# Altium footprint library CADTcommon.PcbLib: 503 footprints (part 1 of 32)
Each footprint in its own frame and in the unit in brackets; x right, y up, seen from the top. Pads: shape width x height; smd on the part's side, far side on the other; paste and mask are expansions set on the pad; w line width, h text height; cw(c..) or ccw(c..) is an arc to the next point about the centre after c.
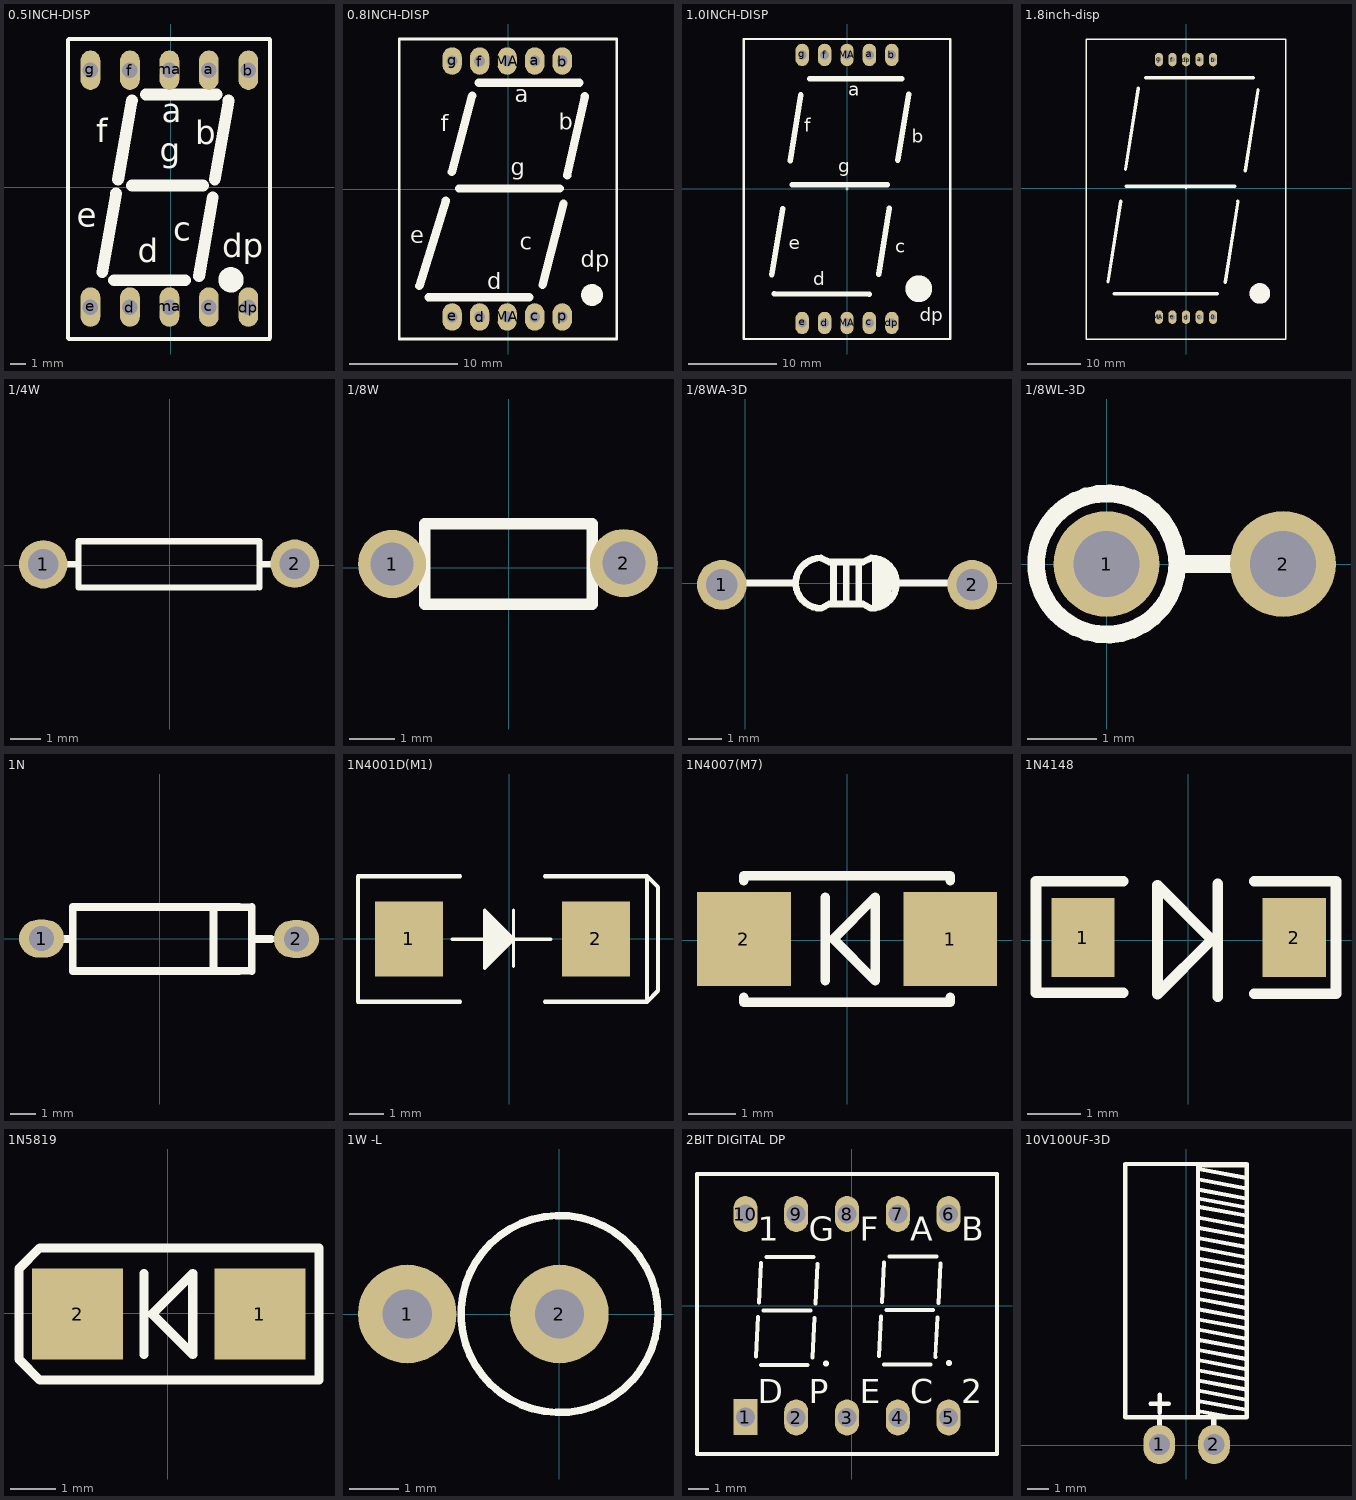
[diagram p0: the footprints below, top view; thin cyan lines are the x and y axes]

## 0.5INCH-DISP [mil]
pads (10):
  oval 50x100 hole 39.37: a(97,297) b(197,297) c(97,-303) d(-103,-303) dp(197,-303) e(-203,-303) f(-103,297) g(-203,297) ma(-3,-303) ma(-3,297)
Top Overlay:
  circle w40: c153,-234 r12
  lines w10: -260,-382 -260,374 ; -258,-384 251,-384 ; -258,376 251,376 ; 252,-380 252,374
  lines w30: -173,-215 -138,-15 ; -143,-235 37,-235 ; -133,20 -98,220 ; -98,5 82,5 ; -63,235 117,235 ; 72,-225 107,-25 ; 112,20 147,220
  text "c" at 7,-135 h60
  text "dp" at 131,-177 h60
  text "e" at -238,-100 h60
  text "d" at -83,-190 h60
  text "a" at -23,165 h60
  text "g" at -28,65 h60
  text "b" at 62,110 h60
  text "f" at -188,115 h60
3D body: height 316.25, standoff -156.19, extent -252,-378 248,372

## 0.8INCH-DISP [mil]
pads (10):
  oval 70x100 hole 39.37: a(97,465) b(197,465) c(97,-465) d(-103,-465) e(-203,-465) f(-103,465) g(-203,465) MA(-3,-465) MA(-3,465) p(197,-465)
Top Overlay:
  circle w40: c305.31,-385 r19.68
  lines w10: -395,-545 -395,545 395,545 395,-545 -395,-545
  lines w30: -322,-352 -226,-42 ; -289,-393 77.14,-393 ; -204,62 -130,339 ; -177.68,2.24 188.47,2.24 ; -108,-478 -103,-473 ; -106.14,386 260,386 ; 125,-349 202,-53 ; 215,49 279,337
  text "a" at 25,315 h60
  text "g" at 10,50 h60
  text "c" at 43,-220 h60
  text "d" at -75,-365 h60
  text "e" at -355,-198 h60
  text "f" at -245,210 h60
  text "dp" at 265,-285 h60
  text "b" at 185,215 h60

## 1.0INCH-DISP [mil]
pads (10):
  oval 60x100 hole 39.37: a(100,598) b(200,598) c(100,-598) d(-100,-598) dp(200,-598) e(-200,-598) f(-100,598) g(-200,598) MA(0,-598) MA(0,598)
Top Overlay:
  lines w2: -6,0 6,0 ; 0,-6 0,5
  lines w10: -461,-10 -461,10 ; -460.88,-669.58 -460.88,669 ; -459.88,-669.58 461,-669.58 461,669 -459.88,669
  lines w25: -335,-382 -287,-89 ; -324,-467 99,-470 ; -254,126 -206,419 ; -244,19 179,19 ; -167,492 245,492 ; 141,-380 189,-87 ; 227,129 275,422
  text "a" at 5,415 h60
  text "b" at 290,205 h60
  text "c" at 215,-285 h60
  text "d" at -150,-430 h60
  text "e" at -260,-270 h60
  text "f" at -190,255 h60
  text "dp" at 325,-590 h60
  text "g" at -40,75 h60
Top Overlay keep-out:
  circle w100: c320.57,-445 r9.43

## 1.8inch-disp [mm]
pads (10):
  oval 1.524x2.54 hole 1: 0(5.08,-24.13) a(2.54,24.13) b(5.08,24.13) c(2.54,-24.13) d(0,-24.13) dp(0,24.13) e(-2.54,-24.13) f(-2.54,24.13) g(-5.08,24.13) MA(-5.08,-24.13)
Top Overlay:
  lines w0.051: -0.127,0 0.127,0 ; 0,-0.127 0,0.102
  lines w0.254: -18.694,-28.219 -18.694,27.981 18.694,27.981 18.694,-28.219 -18.694,-28.219
  lines w0.635: -14.605,-17.551 -12.217,-2.362 ; -13.411,-19.761 5.842,-19.761 ; -11.328,3.531 -8.941,18.72 ; -11.227,0.381 9.119,0.381 ; -7.595,20.701 12.598,20.701 ; 7.341,-17.628 9.728,-2.438 ; 11.1,3.251 13.487,18.44
Top Overlay keep-out:
  circle w2.54: c13.827,-19.685 r0.651

## 1/4W [mm]
pads (2):
  round 1.6 hole 1: 1(-4.172,0.029) 2(4.128,0.049)
Top Overlay:
  lines w0.203: -3.514,0.029 -3.006,0.029 ; 2.836,-0.733 -3.006,-0.733 -3.006,0.791 2.963,0.791 2.963,-0.733 ; 2.963,0.029 3.471,0.029
3D body: height 3.12, standoff -2.06, extent -5.359,-1.092 5.359,1.143

## 1/8W [mm]
pads (2):
  round 1.5 hole 0.95: 1(-2.567,0.084) 2(2.533,0.104)
Top Overlay:
  lines w0.254: -1.845,-0.805 -1.845,0.973 1.838,0.973 1.838,-0.805 -1.845,-0.805

## 1/8WA-3D [mm]
pads (2):
  round 1.5 hole 0.95: 1(-0.711,-0.051) 2(6.858,-0.051)
Top Overlay:
  lines w0.203: 0,0 1.524,0 ; 2.667,-0.635 2.667,0.635 ; 3.048,-0.635 3.048,0.635 ; 3.429,-0.635 3.429,0.635 ; 3.937,-0.635 3.937,0.635 ; 4.064,-0.635 4.064,0.635 ; 4.191,-0.635 4.191,0.508 ; 4.318,-0.381 4.318,0.381 ; 4.445,-0.127 4.445,0.254 ; 4.572,0 6.096,0 ; 2.286,-0.762 cw(c2.286,0) 2.286,0.762 2.54,0.635 3.556,0.635 3.81,0.762 cw(c3.81,0) 3.81,-0.762 3.556,-0.635 2.54,-0.635 2.286,-0.762
3D body: height 2.42, standoff -3.48, extent -0.952,-0.914 7.048,0.886

## 1/8WL-3D [mil]
pads (2):
  round 60 hole 37.4: 1(0,0) 2(100,0)
Top Overlay:
  circle w10: c0,0 r40
  lines w10: 40,0 70,0
3D body: height 285.43, standoff -59.06, extent -36.08,-37 110.08,35.48

## 1N [mm]
pads (2):
  oval 1.8x1.5 hole 1: 1(-4.699,0) 2(5.418,-0.017)
Top Overlay:
  lines w0.3: -3.464,1.253 3.648,1.253 ; 0.846,-1.287 3.648,-1.287
  lines w0.305: -4.226,-0.017 -3.464,-0.017 ; 2.128,-1.287 2.128,1.253 ; 3.14,-1.287 -3.464,-1.287 -3.464,1.253 3.14,1.253 ; 3.648,-1.287 3.648,1.253 ; 3.648,-0.017 4.41,-0.017

## 1N4001D(M1) [mm]
pads (2):
  rect 2x2.2 smd: 1(-2.945,0) 2(2.555,0)
Top Overlay:
  lines w0.1: -1.67,-0.006 1.23,-0.006 ; -0.67,0.744 -0.67,-0.756 0.03,-0.056 0.03,-0.006 -0.62,0.644 -0.62,-0.606 -0.07,-0.056 -0.07,-0.006 -0.57,0.494 -0.52,0.444 -0.52,-0.456 ; -0.62,-0.456 -0.62,-0.506 -0.57,-0.506 -0.17,-0.106 -0.17,-0.006 ; -0.418,-0.254 -0.418,0.142 ; -0.37,0.094 -0.37,-0.156 -0.37,0.194 ; -0.295,-0.131 -0.295,0.119 ; 0.13,-0.806 0.13,0.844 ; -0.17,-0.006 -0.47,0.294 -0.47,-0.306 -0.17,-0.006 ; -0.72,-0.856 -0.72,0.844 0.13,-0.006 -0.72,-0.856
  lines w0.127: -4.445,1.85 -4.445,-1.85 -1.445,-1.85 ; -4.437,1.85 -1.445,1.85 ; 1.055,-1.85 4.055,-1.85 ; 1.055,1.85 4.055,1.85 ; 4.055,-1.85 4.055,1.85 ; 4.055,-1.85 4.38,-1.525 4.38,1.525 4.055,1.85
3D body: height 1, standoff -1.4, extent -2.829,-1.305 2.371,1.295

## 1N4007(M7) [mm]
pads (2):
  rect 2x2 smd: 1(2.193,0.027) 2(-2.207,0.027)
Top Overlay:
  lines w0.2: -2.207,-1.212 -2.207,-1.323 2.193,-1.323 2.193,-1.212 ; -2.207,1.265 -2.207,1.377 2.193,1.377 2.193,1.265 ; -0.474,-0.862 -0.474,0.027 -0.474,0.916 ; -0.296,0.027 0.593,-0.862 0.593,0.916 -0.296,0.027
3D body: height 2.3, standoff 0, extent -2.525,-1.3 2.575,1.3

## 1N4148 [mm]
pads (2):
  rect 1.2x1.5 smd: 1(-1.994,0.053) 2(2.006,0.053)
Top Overlay:
  lines w0.2: -1.232,-0.988 -2.883,-0.988 -2.883,1.12 -1.232,1.12 ; 0.432,0 -0.584,-1.016 -0.584,1.041 0.445,0.013 ; 0.559,-1.069 0.559,1.067 ; 1.244,-1.014 2.794,-1.014 2.794,1.12 2.438,1.12 1.244,1.12
3D body: height 1.5, standoff 0, extent -1.75,-0.699 1.75,0.801

## 1N5819 [mm] "DIODE4007"
pads (2):
  rect 2x2 smd: 1(2.02,-0.018) 2(-1.98,-0.018)
Top Overlay:
  lines w0.2: -0.52,-0.907 -0.52,-0.018 -0.52,0.871 ; -3.263,-1.011 -2.806,-1.468 3.316,-1.468 3.316,1.432 -2.806,1.432 -3.263,0.974 -3.263,-1.011 ; -0.342,-0.018 0.547,0.871 0.547,-0.907 -0.342,-0.018
3D body: height 2.3, standoff 0, extent -2.55,-1.313 2.55,1.287

## 1W -L [mil]
pads (2):
  round 79 hole 39.37: 1(-122.05,0) 2(0,0)
Top Overlay:
  circle w6: c0,0 r79
3D body: height 572.61, standoff -75.5, extent -137.23,-83.35 83.23,82

## 2BIT DIGITAL DP [mm]
pads (10):
  rect 1.2x1.8 hole 0.95: 1(-5.309,-5.574)
  oval 1.2x1.8 hole 0.95: 2(-2.769,-5.59) 3(-0.229,-5.59) 4(2.311,-5.59) 5(4.851,-5.59) 6(4.851,4.586) 7(2.311,4.586) 8(-0.229,4.586) 9(-2.769,4.586) 10(-5.309,4.586)
Top Overlay:
  circle w0.25: c4.869,-2.866 r0.025
  circle w0.25: c-1.277,-2.891 r0.025
  lines w0.2: -4.783,-2.536 -4.681,-0.554 ; -4.63,0.157 -4.529,2.138 ; -4.529,-2.967 -2.192,-2.967 ; -4.402,-0.25 -2.065,-0.25 ; -4.249,2.443 -1.912,2.443 ; -1.963,-2.586 -1.862,-0.605 ; -1.811,0.106 -1.709,2.087 ; 1.364,-2.51 1.466,-0.529 ; 1.517,0.182 1.618,2.163 ; 1.618,-2.942 3.955,-2.942 ; 1.745,-0.224 4.082,-0.224 ; 1.898,2.468 4.234,2.468 ; 4.184,-2.561 4.285,-0.58 ; 4.336,0.131 4.438,2.113 ; -7.729,-7.412 -7.729,6.588 7.271,6.588 7.271,-7.412 -7.729,-7.412
  text "C" at 2.939,-4.872 h1.2
  text "E" at 0.399,-4.872 h1.2
  text "P" at -2.141,-4.872 h1.2
  text "D" at -4.681,-4.872 h1.2
  text "B" at 5.479,3.256 h1.2
  text "A" at 2.939,3.256 h1.2
  text "2" at 5.479,-4.872 h1.2
  text "1" at -4.681,3.256 h1.2
  text "G" at -2.141,3.256 h1.2
  text "F" at 0.399,3.256 h1.2
3D body: height 11.3, standoff 1.13, extent -7.595,-7.386 7.406,6.614

## 10V100UF-3D [mm]
pads (2):
  oval 1.5x1.85 hole 1: 1(-1.276,0.03) 2(1.315,0.03)
Top Overlay:
  lines w0.2: -1.692,1.963 -0.828,1.963 ; -1.26,1.531 -1.26,2.395 ; 0.557,2.584 2.771,2.17 ; 0.558,4.998 2.777,4.583 ; 0.558,5.481 2.779,5.066 ; 0.558,5.964 2.78,5.548 ; 0.558,6.446 2.781,6.031 ; 0.558,7.412 2.783,6.996 ; 0.558,9.343 2.788,8.926 ; 0.559,1.346 0.559,13.259 2.87,13.259 2.87,1.321 -2.896,1.321 -2.896,13.335 2.87,13.335 ; 0.559,11.31 2.836,10.885 ; 0.562,1.617 2.188,1.313 ; 0.562,4.031 2.775,3.618 ; 0.563,8.377 2.786,7.961 ; 0.563,8.86 2.787,8.444 ; 0.563,9.825 2.789,9.409 ; 0.563,10.308 2.791,9.892 ; 0.563,10.791 2.792,10.374 ; 0.567,3.065 2.773,2.653 ; 0.567,7.893 2.785,7.479 ; 0.571,2.098 2.77,1.687 ; 0.578,6.925 2.782,6.513 ; 0.582,4.511 2.776,4.1 ; 0.584,11.691 2.862,11.266 ; 0.588,13.102 2.815,12.686 ; 0.611,3.539 2.774,3.135 ; 0.613,12.111 2.84,11.695 ; 0.614,12.594 2.841,12.178
  lines w0.254: -1.27,0.457 -1.27,1.321 ; 1.295,0.686 1.295,0.838 1.295,1.321
3D body: height 6.4, standoff -2.1, extent -3.2,-0.209 3.231,13.366